# Altium footprint library Main.PcbLib: 50 footprints (part 2 of 4)
Each footprint in its own frame and in the unit in brackets; x right, y up, seen from the top. Pads: shape width x height; smd on the part's side, far side on the other; paste and mask are expansions set on the pad; w line width, h text height; cw(c..) or ccw(c..) is an arc to the next point about the centre after c.
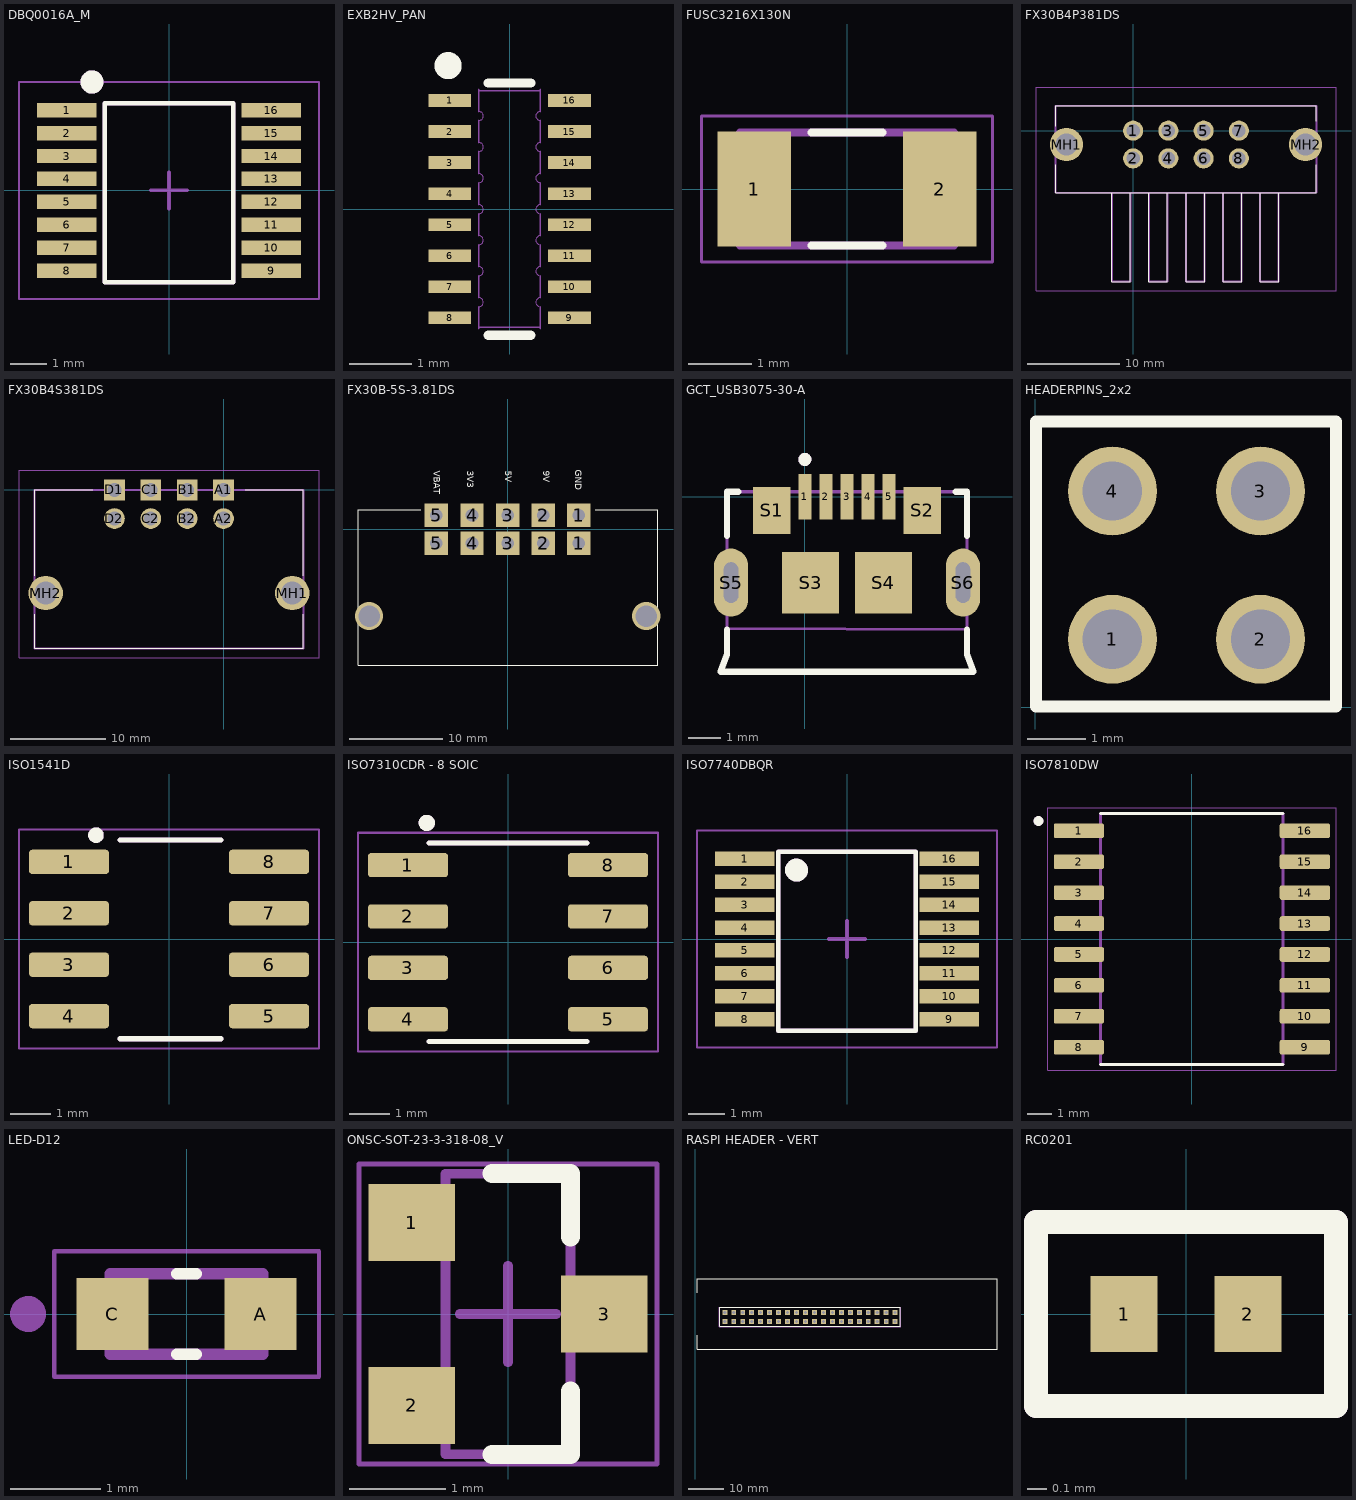
[diagram p1: the footprints below, top view; thin cyan lines are the x and y axes]

## DBQ0016A_M [mm]
pads (16):
  rect 1.65x0.4 smd paste+0 mask+0: 1(-2.825,2.222) 2(-2.825,1.587) 3(-2.825,0.953) 4(-2.825,0.318) 5(-2.825,-0.318) 6(-2.825,-0.953) 7(-2.825,-1.587) 8(-2.825,-2.222) 9(2.825,-2.222) 10(2.825,-1.587) 11(2.825,-0.953) 12(2.825,-0.318) 13(2.825,0.318) 14(2.825,0.953) 15(2.825,1.587) 16(2.825,2.222)
Top Overlay:
  circle w0.381: c-2.131,3 r0.127
  lines w0.127: -1.778,-2.54 -1.778,2.413 1.778,2.413 1.778,-2.54 -1.778,-2.54
Mechanical 15:
  lines w0.05: -4.15,-3 -4.15,3 4.15,3 4.15,-3 -4.15,-3
  lines w0.1: -0.5,0 0.5,0 ; 0,-0.5 0,0.5
Mechanical 29:
  circle w0.381: c-2.131,3 r0.127
  lines w0.127: -1.778,-2.54 -1.778,2.413 1.778,2.413 1.778,-2.54 -1.778,-2.54
  text "'.Designator'String" at -1.805,-2.207 h0.7
3D body "DBQ0016A.stp": height 1.46, standoff -0.17, extent -3.011,-2.451 3.011,2.451

## EXB2HV_PAN [mil]
pads (16):
  rect 27x8 smd paste+0 mask+0: 1(-38,68.9) 2(-38,49.21) 3(-38,29.53) 4(-38,9.84) 5(-38,-9.84) 6(-38,-29.53) 7(-38,-49.21) 8(-38,-68.9) 9(38,-68.9) 10(38,-49.21) 11(38,-29.53) 12(38,-9.84) 13(38,9.84) 14(38,29.53) 15(38,49.21) 16(38,68.9)
Top Overlay:
  circle w10: c-39,91 r3.61
  lines w6: -13.49,-80 13.49,-80 ; -13.49,80 13.49,80
Mechanical 13:
  lines w0: -19.5,-61.9 ccw(c-19.5,-59.06) -19.5,-56.21 ; -19.5,-42.21 ccw(c-19.5,-39.37) -19.5,-36.53 ; -19.5,-22.53 ccw(c-19.5,-19.68) -19.5,-16.84 ; -19.5,-2.84 ccw(c-19.5,0) -19.5,2.84 ; -19.5,16.84 ccw(c-19.5,19.69) -19.5,22.53 ; -19.5,36.53 ccw(c-19.5,39.37) -19.5,42.21 ; -19.5,56.21 ccw(c-19.5,59.06) -19.5,61.9 ; 19.5,-61.9 cw(c19.5,-59.06) 19.5,-56.21 ; 19.5,-42.21 cw(c19.5,-39.37) 19.5,-36.53 ; 19.5,-22.53 cw(c19.5,-19.68) 19.5,-16.84 ; 19.5,-2.84 cw(c19.5,0) 19.5,2.84 ; 19.5,16.84 cw(c19.5,19.69) 19.5,22.53 ; 19.5,36.53 cw(c19.5,39.37) 19.5,42.21 ; 19.5,56.21 cw(c19.5,59.06) 19.5,61.9
  lines w1: -19.5,-61.9 -19.5,-75.9 -19.5,-75 19.5,-75 19.5,-75.9 19.5,-61.9 ; -19.5,-56.21 -19.5,-42.21 ; -19.5,-36.53 -19.5,-22.53 ; -19.5,-16.84 -19.5,-2.84 ; -19.5,2.84 -19.5,16.84 ; -19.5,22.53 -19.5,36.53 ; -19.5,42.21 -19.5,56.21 ; -19.5,61.9 -19.5,75.9 -19.5,75 19.5,75 19.5,75.9 19.5,61.9 ; 19.5,-56.21 19.5,-42.21 ; 19.5,-36.53 19.5,-22.53 ; 19.5,-16.84 19.5,-2.84 ; 19.5,2.84 19.5,16.84 ; 19.5,22.53 19.5,36.53 ; 19.5,42.21 19.5,56.21
  text "*" at -22,42.9 h50
3D body: height 10, standoff 0, extent 0,0 10,10
3D body "EXB2HV_PAN.step": height 18.03, standoff 0, extent -20.5,-78.9 20.52,72.91

## FUSC3216X130N [mm]
pads (2):
  rect 1.17x1.82 smd: 1(-1.47,0) 2(1.47,0)
Top Overlay:
  lines w0.127: -0.56,-0.9 0.56,-0.9 ; -0.56,0.9 0.56,0.9
Mechanical 4:
  lines w0.127: -1.7,-0.9 -1.7,0.9 ; -1.7,-0.9 1.7,-0.9 ; -1.7,-0.9 -1.7,0.9 ; -1.7,-0.9 1.7,-0.9 ; -1.7,0.9 1.7,0.9 ; -1.7,0.9 1.7,0.9 ; 1.7,-0.9 1.7,0.9 ; 1.7,-0.9 1.7,0.9
Mechanical 16:
  lines w0.05: -2.308,-1.158 -2.308,1.158 2.308,1.158 2.308,-1.158 -2.308,-1.158

## FX30B4P381DS [mm]
pads (10):
  round 2.175 hole 1.45: 1(0,0) 2(0,-3) 3(3.81,0) 4(3.81,-3) 5(7.62,0) 6(7.62,-3) 7(11.43,0) 8(11.43,-3)
  round 3.6 hole 2.4: MH1(-7.2,-1.5) MH2(18.63,-1.5)
Top Overlay:
  lines w0.1: -8.375,-3.7 -8.375,-6.7 -4.285,-6.7 19.805,-6.7 19.805,-3.7 ; -8.375,0.5 -8.375,2.7 19.805,2.7 19.805,1 ; -2.285,-6.7 -2.285,-16.3 -0.285,-16.3 -0.285,-6.7 ; 1.715,-6.7 1.715,-16.3 3.715,-16.3 3.715,-6.7 ; 5.715,-6.7 5.715,-16.3 7.715,-16.3 7.715,-6.7 ; 9.715,-6.7 9.715,-16.3 11.715,-16.3 11.715,-6.7 ; 13.715,-6.7 13.715,-16.3 15.715,-16.3 15.715,-6.7
Mechanical 13:
  lines w0.2: -2.285,-6.7 -2.285,-16.3 -0.285,-16.3 -0.285,-6.7 ; 1.715,-6.7 1.715,-16.3 3.715,-16.3 3.715,-6.7 ; 5.715,-6.7 5.715,-16.3 7.715,-16.3 7.715,-6.7 ; 9.715,-6.7 9.715,-16.3 11.715,-16.3 11.715,-6.7 ; 13.715,-6.7 13.715,-16.3 15.715,-16.3 15.715,-6.7 ; -8.375,-6.7 -8.375,2.7 19.805,2.7 19.805,-6.7 -8.375,-6.7
Mechanical 15:
  lines w0.1: -10.487,-17.3 -10.487,4.7 21.917,4.7 21.917,-17.3 -10.487,-17.3
3D body "FX30B-4P-3.81DS.stp": height 11.52, standoff -2.78, extent -8.407,-17.481 19.772,2.719

## FX30B4S381DS [mm]
pads (10):
  rect 2.175x2.175 hole 1.45: A1(0,0) B1(-3.81,0) C1(-7.62,0) D1(-11.43,0)
  round 2.175 hole 1.45: A2(0,-3) B2(-3.81,-3) C2(-7.62,-3) D2(-11.43,-3)
  round 3.6 hole 2.4: MH1(7.2,-10.8) MH2(-18.63,-10.8)
Top Overlay:
  lines w0.1: -19.805,-16.6 8.375,-16.6 8.375,-13 ; -19.805,-9 -19.805,0 -13.715,0 ; 2.285,0 8.375,0 8.375,-9
  lines w0.127: -19.805,-16.6 -19.805,-13
Mechanical 13:
  lines w0.2: -19.805,-16.6 -19.805,0 8.375,0 8.375,-16.6 -19.805,-16.6
Mechanical 15:
  lines w0.1: -21.43,-17.6 -21.43,2.087 10,2.087 10,-17.6 -21.43,-17.6
Mechanical 29:
  text "'.Designator'String" at -18.748,0.989 h0.7
3D body "FX30B-4S-3.81DS.stp": height 11.11, standoff -3.19, extent -19.802,-15.999 8.378,0.601

## FX30B-5S-3.81DS [mm]
pads (10):
  rect 2.5x2.5 hole 1.35: 1(7.62,-1.5) 1(7.62,1.5) 2(3.81,-1.5) 2(3.81,1.5) 3(0,-1.5) 3(0,1.5) 4(-3.81,-1.5) 4(-3.81,1.5) 5(-7.62,-1.5) 5(-7.62,1.5)
via -14.82,-9.3 diameter 3 hole 2.3
via 14.82,-9.3 diameter 3 hole 2.3
Top Overlay:
  lines w0.127: -9.302,2.083 -16.002,2.083 -16.002,-14.529 16.078,-14.529 16.078,2.083 ; 9.373,2.083 16.073,2.083
  text "3V3" at -4.345,6.25 h0.7
  text "5V" at -0.281,6.25 h0.7
  text "9V" at 3.783,6.25 h0.7
  text "GND" at 7.212,6.377 h0.7
  text "VBAT" at -7.901,6.25 h0.7
3D body "FX30B-5S-3.81DS.stp": height 11.01, standoff -3.3, extent -15.947,-14.492 16.048,2.108

## GCT_USB3075-30-A [mm]
pads (11):
  rect 0.4x1.4 smd mask+0.076: 1(0,0) 2(0.65,0) 3(1.3,0) 4(1.95,0) 5(2.6,0)
  rect 1.15x1.45 smd: S1(-1.02,-0.42) S2(3.62,-0.42)
  rect 1.75x1.9 smd: S3(0.175,-2.65) S4(2.425,-2.65)
  oval 1.05x2.1 hole 0.45 slot 1.25 at 90 deg: S5(-2.275,-2.65) S6(4.875,-2.65)
Top Overlay:
  circle w0.2: c0,1.15 r0.1
  lines w0.2: -2.4,-4.1 -2.4,-4.86 -2.6,-5.4 5.2,-5.4 5,-4.86 5,-4.1 ; -2.4,-1.2 -2.4,0.15 -2.05,0.15 ; 4.65,0.15 5,0.15 5,-1.2
Mechanical 13:
  circle w0.2: c0,1.15 r0.1
  lines w0.1: -2.413,-4.064 4.953,-4.091 ; -2.6,-5.4 5.2,-5.4 5,-4.86 5,0.15 -2.4,0.15 -2.4,-4.86 -2.6,-5.4
3D body "WQ-1700380_ZX62D-B-5P8(30).stp": height 2.78, standoff -0.77, extent -2.777,-5.271 5.317,0.541

## HEADERPINS_2x2 [mil]
pads (4):
  round 60 hole 40: 1(52,46) 2(152,46) 3(152,146) 4(52,146)
Top Overlay:
  lines w7.87: 0.46,0.54 203,0.54 203,193 0.46,193 0.46,0.54
3D body "2x2.stp": height 330.5, standoff -99.5, extent 2,-3 202,197

## ISO1541D [mm]
pads (8):
  rrect25% 1.97x0.6 smd: 1(-2.47,1.905) 2(-2.47,0.635) 3(-2.47,-0.635) 4(-2.47,-1.905) 5(2.47,-1.905) 6(2.47,-0.635) 7(2.47,0.635) 8(2.47,1.905)
Top Overlay:
  circle w0.2: c-1.803,2.565 r0.092
  lines w0.127: -1.209,-2.463 1.28,-2.463 ; -1.209,2.442 1.28,2.442
Mechanical 13:
  circle w0.2: c-1.803,2.565 r0.092
  lines w0.127: -1.209,-2.463 1.28,-2.463 ; -1.209,2.442 1.28,2.442
Mechanical 15:
  lines w0.05: -3.705,-2.702 -3.705,2.702 3.705,2.702 3.705,-2.702 -3.705,-2.702
Mechanical 29:
  circle w0.2: c-1.803,2.565 r0.092
  lines w0.127: -1.209,-2.463 1.28,-2.463 ; -1.209,2.442 1.28,2.442
  text "'.Designator'String" at -1.678,-1.953 h0.7
3D body "ISO1541D.STEP": height 1.51, standoff -0.24, extent -2.997,-2.451 2.997,2.451

## ISO7310CDR - 8 SOIC [mm]
pads (8):
  rrect25% 1.97x0.6 smd: 1(-2.47,1.905) 2(-2.47,0.635) 3(-2.47,-0.635) 4(-2.47,-1.905) 5(2.47,-1.905) 6(2.47,-0.635) 7(2.47,0.635) 8(2.47,1.905)
Top Overlay:
  circle w0.2: c-2.007,2.946 r0.1
  lines w0.127: -1.95,-2.452 1.95,-2.452 ; -1.95,2.452 1.95,2.452
Mechanical 13:
  circle w0.2: c-2.007,2.946 r0.1
  lines w0.127: -1.95,-2.452 1.95,-2.452 ; -1.95,2.452 1.95,2.452
Mechanical 15:
  lines w0.05: -3.705,-2.702 3.705,-2.702 3.705,2.702 -3.705,2.702 -3.705,-2.702
Mechanical 29:
  circle w0.2: c-2.007,2.946 r0.1
  lines w0.127: -1.95,-2.452 1.95,-2.452 ; -1.95,2.452 1.95,2.452
  text "'.Designator'String" at -1.85,-2.119 h0.7
3D body "ISO7310CDR.STEP": height 1.51, standoff -0.24, extent -2.997,-2.451 2.997,2.451

## ISO7740DBQR [mm]
pads (16):
  rect 1.65x0.4 smd paste+0 mask+0: 1(-2.825,2.222) 2(-2.825,1.587) 3(-2.825,0.953) 4(-2.825,0.318) 5(-2.825,-0.318) 6(-2.825,-0.953) 7(-2.825,-1.587) 8(-2.825,-2.222) 9(2.825,-2.222) 10(2.825,-1.587) 11(2.825,-0.953) 12(2.825,-0.318) 13(2.825,0.318) 14(2.825,0.953) 15(2.825,1.587) 16(2.825,2.222)
Top Overlay:
  circle w0.381: c-1.397,1.905 r0.127
  lines w0.127: -1.905,-2.54 -1.905,2.413 1.905,2.413 1.905,-2.54 -1.905,-2.54
Mechanical 1:
  lines w0.127: -1.905,-2.54 -1.905,2.413 1.905,2.413 1.905,-2.54 -1.905,-2.54
Mechanical 13:
  lines w0.127: -1.905,-2.54 -1.905,2.413 1.905,2.413 1.905,-2.54 -1.905,-2.54
Mechanical 15:
  lines w0.05: -4.15,-3 -4.15,3 4.15,3 4.15,-3 -4.15,-3
  lines w0.1: -0.5,0 0.5,0 ; 0,-0.5 0,0.5
Mechanical 29:
  circle w0.381: c-1.397,1.905 r0.127
  lines w0.127: -1.905,-2.54 -1.905,2.413 1.905,2.413 1.905,-2.54 -1.905,-2.54
  text "'.Designator'String" at -1.805,-2.207 h0.7
3D body: height 0.25, standoff 0, extent 0,0 0.254,0.254
3D body "DBQ0016A.stp": height 1.46, standoff -0.17, extent -3.011,-2.451 3.011,2.451

## ISO7810DW [mm]
pads (16):
  rrect25% 2.06x0.6 smd: 1(-4.64,4.445) 2(-4.64,3.175) 3(-4.64,1.905) 4(-4.64,0.635) 5(-4.64,-0.635) 6(-4.64,-1.905) 7(-4.64,-3.175) 8(-4.64,-4.445) 9(4.64,-4.445) 10(4.64,-3.175) 11(4.64,-1.905) 12(4.64,-0.635) 13(4.64,0.635) 14(4.64,1.905) 15(4.64,3.175) 16(4.64,4.445)
Top Overlay:
  circle w0.2: c-6.3,4.845 r0.1
  lines w0.127: -3.75,-5.15 3.75,-5.15 ; -3.75,5.15 3.75,5.15
Mechanical 13:
  circle w0.2: c-6.3,4.845 r0.1
  lines w0.127: -3.75,-5.15 3.75,-5.15 3.75,5.15 -3.75,5.15 -3.75,-5.15
Mechanical 15:
  lines w0.05: -5.92,-5.4 5.92,-5.4 5.92,5.4 -5.92,5.4 -5.92,-5.4
3D body "ISO7810DW.STEP": height 2.36, standoff -0.29, extent -5.15,-5.15 5.15,5.15

## LED-D12 [mm]
pads (2):
  rect 0.8x0.8 smd: A(0.825,0) C(-0.825,0)
Top Overlay:
  lines w0.127: -0.11,-0.45 0.11,-0.45 ; -0.11,0.45 0.11,0.45
Mechanical 4:
  circle w0.2: c-1.765,0 r0.1
  circle w0.2: c-1.765,0 r0.1
  lines w0.127: -0.85,-0.45 -0.85,0.45 ; -0.85,-0.45 0.85,-0.45 ; -0.85,-0.45 -0.85,0.45 ; -0.85,-0.45 0.85,-0.45 ; -0.85,0.45 0.85,0.45 ; -0.85,0.45 0.85,0.45 ; 0.85,-0.45 0.85,0.45 ; 0.85,-0.45 0.85,0.45
Mechanical 16:
  lines w0.05: -1.475,-0.7 -1.475,0.7 1.475,0.7 1.475,-0.7 -1.475,-0.7
3D body "LTST-C190KRKT--3DModel-STEP-56544.STEP": height 0.81, standoff 0.01, extent -0.8,-0.4 0.8,0.4

## ONSC-SOT-23-3-318-08_V [mm]
pads (3):
  rect 0.9x0.8 smd: 1(-1,0.95) 2(-1,-0.95) 3(1,0)
Top Overlay:
  lines w0.2: -0.165,-1.46 0.65,-1.46 0.65,-0.8 ; -0.165,1.46 0.65,1.46 0.65,0.8
Mechanical 13:
  lines w0.1: -0.65,-1.46 0.65,-1.46 0.65,1.46 -0.65,1.46 -0.65,-1.46
Mechanical 15:
  lines w0.05: -1.55,-1.56 1.55,-1.56 1.55,1.56 -1.55,1.56 -1.55,-1.56
  lines w0.1: -0.5,0 0.5,0 ; 0,-0.5 0,0.5
3D body: height 1.11, standoff 0.01, extent -0.65,-1.46 0.65,1.46

## RASPI HEADER - VERT [mil]
pads (40):
  rect 55.04x55.04 hole 35.04: 1(330,-2017) 2(330,-2117) 3(430,-2017) 4(430,-2117) 5(530,-2017) 6(530,-2117) 7(630,-2017) 8(630,-2117) 9(730,-2017) 10(730,-2117) 11(830,-2017) 12(830,-2117) 13(930,-2017) 14(930,-2117) 15(1030,-2017) 16(1030,-2117) 17(1130,-2017) 18(1130,-2117) 19(1230,-2017) 20(1230,-2117) 21(1330,-2017) 22(1330,-2117) 23(1430,-2017) 24(1430,-2117) 25(1530,-2017) 26(1530,-2117) 27(1630,-2017) 28(1630,-2117) 29(1730,-2017) 30(1730,-2117) 31(1830,-2017) 32(1830,-2117) 33(1930,-2017) 34(1930,-2117) 35(2030,-2017) 36(2030,-2117) 37(2130,-2017) 38(2131,-2118) 39(2230,-2017) 40(2230,-2117)
Top Overlay:
  lines w5: 20,-2267 20,-2425 3366,-2425 3366,-1640 20,-1640 20,-1798
  lines w7.87: 275,-2170 275,-1960 2285,-1960 2285,-2170 275,-2170
Bottom Overlay:
  lines w7.87: 275,-2170 275,-1960 2285,-1960 2285,-2170 275,-2170
Mechanical 16:
  lines w1.97: 270,-2175 270,-1955 2290,-1955 2290,-2175 270,-2175
3D body "Raspberry Pi 4 Model B.STEP": height 2574.8, standoff 275.59, extent 26.78,-2434.17 3530.32,-1650.7
3D body "40Pin.SLDPRT": height 533.96, standoff -176.67, extent 271.38,-2164.72 2295,-1967.87

## RC0201 [mm]
pads (2):
  rect 0.35x0.4 smd: 1(-0.325,0) 2(0.325,0)
Top Overlay:
  lines w0.127: -0.787,-0.483 -0.787,0.483 0.787,0.483 0.787,-0.483 -0.787,-0.483
Mechanical 29:
  lines w0.127: -0.787,-0.483 -0.787,0.483 0.787,0.483 0.787,-0.483 -0.787,-0.483
  text "'.Designator'" at -0.635,-0.229 h0.38
3D body "YAG_R0201_YAG.step": height 0.25, standoff 0, extent -0.318,-0.165 0.318,0.165